# Altium footprint library 1.08-LED发光二极管.PcbLib: 72 footprints (part 2 of 5)
Each footprint in its own frame and in the unit in brackets; x right, y up, seen from the top. Pads: shape width x height; smd on the part's side, far side on the other; paste and mask are expansions set on the pad; w line width, h text height; cw(c..) or ccw(c..) is an arc to the next point about the centre after c.
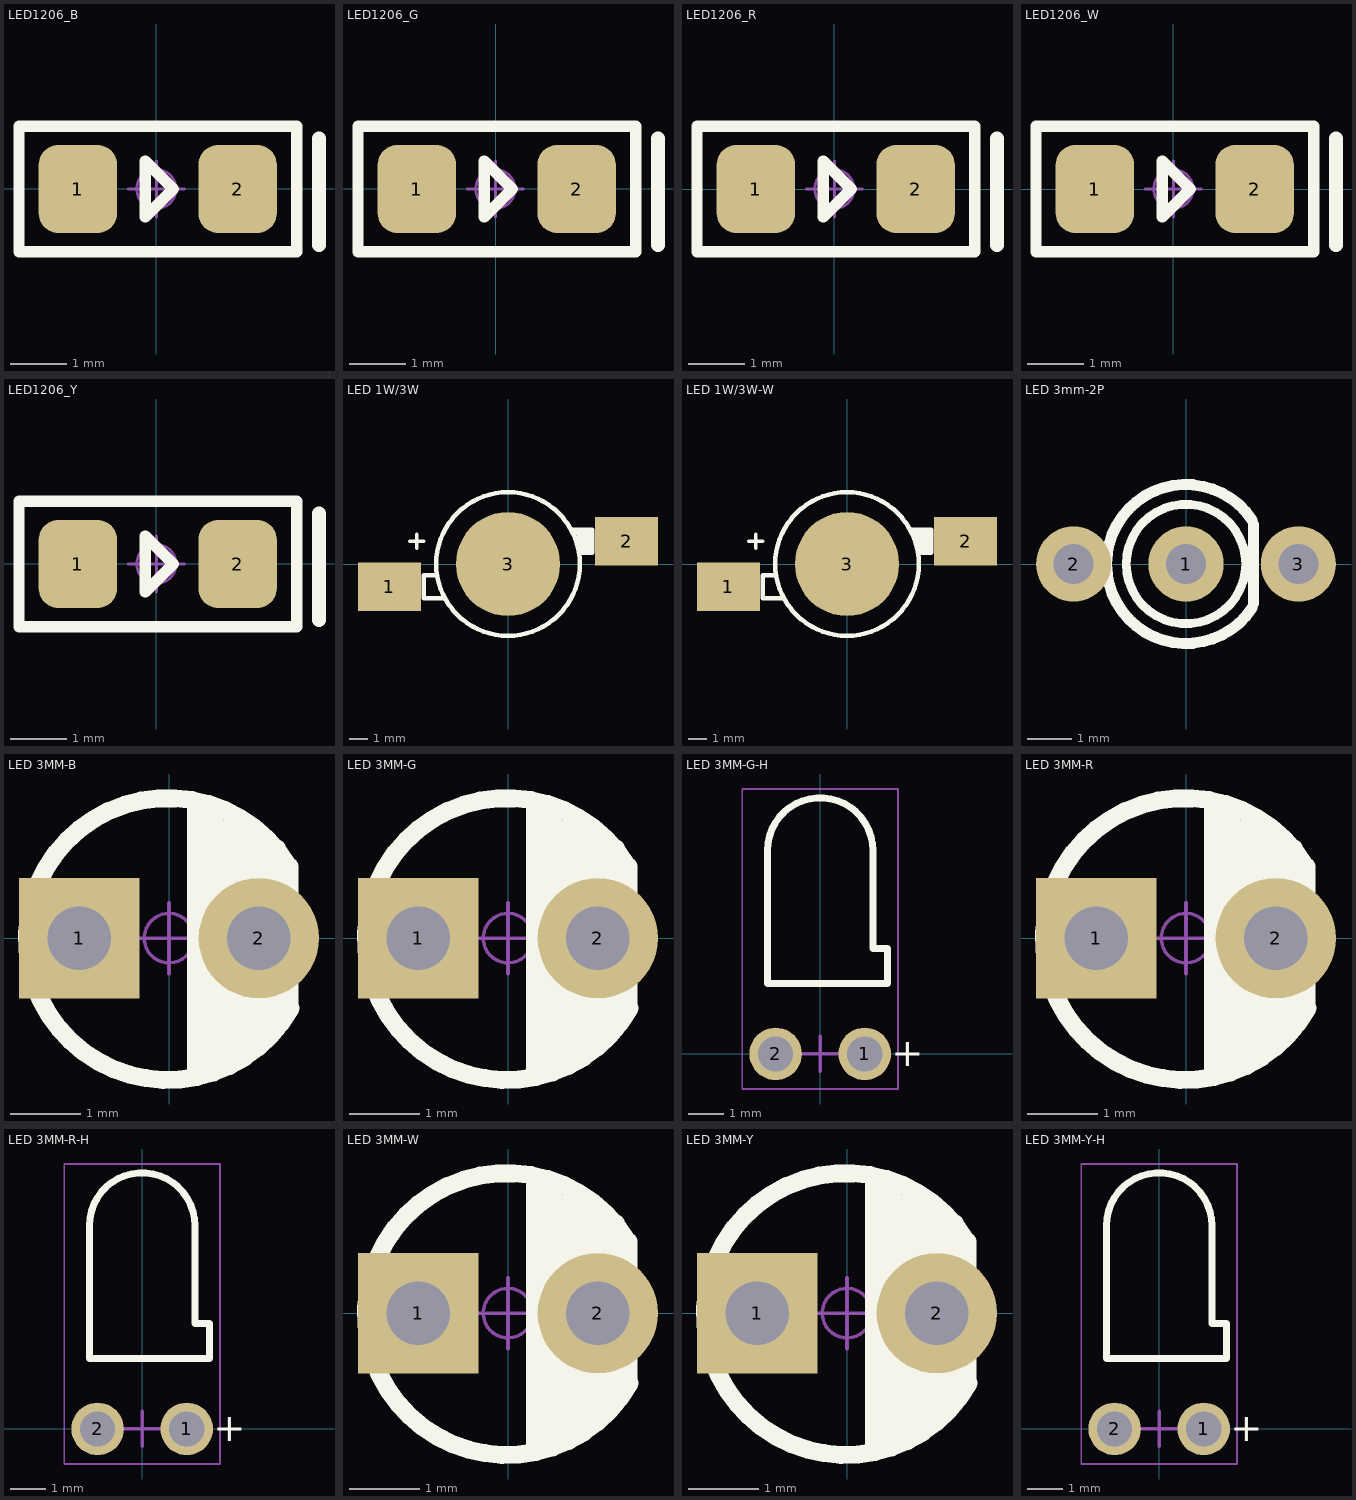
[diagram p1: the footprints below, top view; thin cyan lines are the x and y axes]

## LED1206_B [mil] "蓝色1206LED                             淘宝卖家ID:黄晶宝石"
pads (2):
  rrect50% 55x62 smd: 1(-55.12,0) 2(57.08,0)
Top Overlay:
  lines w8: -7.87,-19.68 -7.87,-19.68 ; -7.87,-19.68 11.81,0 -7.87,19.69 -7.87,-19.68 ; -96.46,-44 98.42,-44 98.42,44 -96.46,44 -96.46,-44
  lines w10: 114.17,-39.37 114.17,35.43
Mechanical 15:
  circle w1.97: c0,0 r13.78
  lines w1.97: -19.69,0 19.68,0 ; 0,-19.69 0,19.68
3D body: height 35.58, standoff -0.04, extent -63.02,-31.53 63.04,31.54
3D body: height 0, standoff 0, extent 0,0 0,0

## LED1206_G [mil] "绿色1206LED                             淘宝卖家ID:黄晶宝石"
pads (2):
  rrect50% 55x62 smd: 1(-55.28,0) 2(56.93,0)
Top Overlay:
  lines w8: -8.03,-19.68 -8.03,19.69 11.65,0 -8.03,-19.68 ; -8.03,-19.68 -8.03,-19.68 ; -96.62,-44 -96.62,44 98.27,44 98.27,-44 -96.62,-44
  lines w10: 114.02,-39.37 114.02,35.43
Mechanical 15:
  circle w1.97: c-0.16,0 r13.78
  lines w1.97: -19.84,0 19.52,0 ; -0.16,-19.69 -0.16,19.68
3D body: height 35.56, standoff -0.04, extent -63.19,-31.54 62.87,31.53
3D body: height 0, standoff 0, extent -0.16,0 -0.16,0

## LED1206_R [mil] "红色1206LED                            淘宝卖家ID:黄晶宝石"
pads (2):
  rrect50% 55x62 smd: 1(-55.12,0) 2(57.09,0)
Top Overlay:
  lines w8: -7.87,-19.68 -7.87,19.69 11.81,0 -7.87,-19.68 ; -7.87,-19.68 -7.87,-19.68 ; -96.46,-44 -96.46,44 98.43,44 98.43,-44 -96.46,-44
  lines w10: 114.18,-39.37 114.18,35.44
Mechanical 15:
  circle w1.97: c0,0 r13.78
  lines w1.97: -19.68,0 19.68,0 ; 0,-19.68 0,19.68
3D body: height 35.56, standoff -0.04, extent -63.03,-31.54 63.03,31.53
3D body: height 0, standoff 0, extent 0,0 0,0

## LED1206_W [mil] "白色1206LED                            淘宝卖家ID:黄晶宝石"
pads (2):
  rrect50% 55x62 smd: 1(-55.12,0) 2(57.09,0)
Top Overlay:
  lines w8: -7.87,-19.68 -7.87,-19.68 ; -7.87,-19.68 11.81,0 -7.87,19.69 -7.87,-19.68 ; -96.46,-44 98.43,-44 98.43,44 -96.46,44 -96.46,-44
  lines w10: 114.18,-39.37 114.18,35.44
Mechanical 15:
  circle w1.97: c0,0 r13.78
  lines w1.97: -19.68,0 19.68,0 ; 0,-19.68 0,19.68
3D body: height 0, standoff 0, extent 0,0 0,0
3D body: height 35.56, standoff -0.04, extent -63.03,-31.54 63.03,31.54

## LED1206_Y [mil] "黄色1206LED                            淘宝卖家ID:黄晶宝石"
pads (2):
  rrect50% 55x62 smd: 1(-55.12,-0.01) 2(57.08,-0.01)
Top Overlay:
  lines w8: -7.88,-19.69 -7.88,19.68 11.81,0 -7.88,-19.69 ; -7.88,-19.69 -7.88,-19.69 ; -96.46,-44.01 -96.46,43.99 98.42,43.99 98.42,-44.01 -96.46,-44.01
  lines w10: 114.17,-39.37 114.17,35.43
Mechanical 15:
  circle w1.97: c-0.01,-0.01 r13.78
  lines w1.97: -19.69,-0.01 19.68,-0.01 ; -0.01,-19.69 -0.01,19.68
3D body: height 35.56, standoff -0.04, extent -63.04,-31.54 63.02,31.53
3D body: height 0, standoff 0, extent 0,0 0,0

## LED 1W/3W [mm] "大功率LED"
pads (3):
  rect 3.5x2.7 smd: 1(-6.604,-1.27) 2(6.604,1.27)
  round 5.8 smd: 3(0,0)
Top Overlay:
  circle w0.254: c0,0 r4
  lines w0.203: -5.461,1.27 -4.699,1.27 ; -5.08,0.889 -5.08,1.651
  lines w0.254: -4.064,-0.635 -4.699,-0.635 -4.699,-1.905 -3.556,-1.905 ; 3.937,1.524 ccw(c3.556,1.524) 3.556,1.905 4.699,1.905 4.699,0.635 4.064,0.635 cw(c4.064,0.762) 3.937,0.762 3.937,1.905 ; 4.191,0.635 4.191,1.905 ; 4.445,0.635 4.445,1.905
Mechanical 15:
  circle w0.05: c0,0 r0.35
  lines w0.05: -0.5,0 0.5,0 ; 0,-0.5 0,0.5
3D body: height 3.65, standoff 0.05, extent -7.2,-4 7.2,4

## LED 1W/3W-W [mm] "白色，大功率LED"
pads (3):
  rect 3.5x2.7 smd: 1(-6.604,-1.27) 2(6.604,1.27)
  round 5.8 smd: 3(0,0)
Top Overlay:
  circle w0.254: c0,0 r4
  circle w0.254: c0,0 r2.65
  lines w0.203: -5.461,1.27 -4.699,1.27 ; -5.08,0.889 -5.08,1.651
  lines w0.254: -4.064,-0.635 -4.699,-0.635 -4.699,-1.905 -3.556,-1.905 ; 3.556,1.905 4.699,1.905 4.699,0.635 4.064,0.635 4.064,1.778 ccw(c3.937,1.778) 3.937,1.905 ; 3.683,1.905 cw(c3.683,1.778) 3.81,1.778 3.81,1.524 ; 3.81,1.905 cw(c3.81,1.778) 3.937,1.778 3.937,1.27 ; 4.191,0.635 4.191,1.905 ; 4.445,0.635 4.445,1.905
Mechanical 15:
  circle w0.05: c0,0 r0.35
  lines w0.05: -0.5,0 0.5,0 ; 0,-0.5 0,0.5
3D body: height 3.65, standoff 0.05, extent -7.2,-4 7.2,4

## LED 3mm-2P [mm] "3mm双色LED            联系卖家 免费查找封装"
height 5
pads (3):
  round 1.7 hole 0.9: 1(0,0) 2(-2.54,0) 3(2.54,0)
Top Overlay:
  circle w0.2: c0,0 r1.35
  lines w0.254: 1.494,-0.996 cw(c0,0) 1.494,0.996 ; 1.524,-0.889 1.524,0.889
3D body: height 3.82, standoff -3.15, extent -2.79,-0.743 2.79,0.743
3D body: height 6.9, standoff 1.4, extent -1.95,-1.95 1.696,1.95

## LED 3MM-B [mm] "蓝色3mm直插LED                       联系卖家 免费查找封装"
height 6.35
pads (2):
  rect 1.7x1.7 hole 0.9: 1(-1.27,0)
  round 1.7 hole 0.9: 2(1.27,0)
Top Overlay:
  lines w0.254: 0.381,-1.905 0.381,1.905 ; 0.635,-1.778 0.635,1.778 ; 1.016,-1.651 1.016,1.524 ; 1.524,1.27 1.524,-1.27 1.27,-1.524 1.27,1.397 1.143,1.524 1.016,1.524 ; 1.685,1.025 ccw(c-0.016,-0.012) 1.72,-0.987 ; 1.702,-0.965 1.702,1.016 ; 0.889,1.651 1.016,1.524 ; 0.889,1.651 0.889,-1.778 0.889,1.651
Mechanical 15:
  circle w0.05: c0,0 r0.35
  lines w0.05: -0.5,0 0.5,0 ; 0,-0.5 0,0.5
3D body: height 3, standoff -3.45, extent -1.623,-0.838 1.618,0.838
3D body: height 5.55, standoff 0.05, extent -1.95,-1.95 1.638,1.95

## LED 3MM-G [mm] "绿色3mm直插LED                       联系卖家 免费查找封装"
height 6.35
pads (2):
  rect 1.7x1.7 hole 0.9: 1(-1.27,0)
  round 1.7 hole 0.9: 2(1.27,0)
Top Overlay:
  lines w0.254: 0.381,-1.905 0.381,1.905 ; 0.635,-1.778 0.635,1.778 ; 1.016,-1.651 1.016,1.524 ; 1.524,1.27 1.524,-1.27 1.27,-1.524 1.27,1.397 1.143,1.524 1.016,1.524 ; 1.685,1.025 ccw(c-0.016,-0.012) 1.72,-0.987 ; 1.702,-0.965 1.702,1.016 ; 0.889,1.651 0.889,-1.778 0.889,1.651 ; 0.889,1.651 1.016,1.524
Mechanical 15:
  circle w0.05: c0,0 r0.35
  lines w0.05: -0.5,0 0.5,0 ; 0,-0.5 0,0.5
3D body: height 3.01, standoff -3.45, extent -1.623,-0.838 1.618,0.838
3D body: height 5.55, standoff 0.05, extent -1.95,-1.95 1.638,1.95

## LED 3MM-G-H [mm] "绿色3mm直插LED  卧式安装"
pads (2):
  round 1.5 hole 1: 1(1.27,0) 2(-1.27,0)
Top Overlay:
  lines w0.2: -1.5,2 -1.5,5.8 cw(c0,5.8) 1.5,5.8 1.5,3 1.925,3 1.925,2 -1.5,2
  text "+" at 2.95,-0.35 h0.8
Mechanical 13:
  lines w0.1: -1.5,2 -1.5,5.8 cw(c0,5.8) 1.5,5.8 1.5,3 1.925,3 1.925,2 -1.5,2
Mechanical 15:
  lines w0.05: -2.22,-1 2.22,-1 2.22,7.55 -2.22,7.55 -2.22,-1
  lines w0.1: -0.5,0 0.5,0 ; 0,-0.5 0,0.5
3D body: height 3.92, standoff -3.2, extent -1.645,-0.25 1.92,7.3

## LED 3MM-R [mm] "红色3mm直插LED                        联系卖家 免费查找封装"
height 6.35
pads (2):
  rect 1.7x1.7 hole 0.9: 1(-1.27,0)
  round 1.7 hole 0.9: 2(1.27,0)
Top Overlay:
  lines w0.254: 0.381,-1.905 0.381,1.905 ; 0.635,-1.778 0.635,1.778 ; 1.016,-1.651 1.016,1.524 ; 1.524,1.27 1.524,-1.27 1.27,-1.524 1.27,1.397 1.143,1.524 1.016,1.524 ; 1.685,1.025 ccw(c-0.016,-0.012) 1.72,-0.987 ; 1.702,-0.965 1.702,1.016 ; 0.889,1.651 0.889,-1.778 0.889,1.651 ; 0.889,1.651 1.016,1.524
Mechanical 15:
  circle w0.05: c0,0 r0.35
  lines w0.05: -0.5,0 0.5,0 ; 0,-0.5 0,0.5
3D body: height 5.55, standoff 0.05, extent -1.95,-1.95 1.638,1.95
3D body: height 3.01, standoff -3.45, extent -1.639,-0.85 1.603,0.827

## LED 3MM-R-H [mm] "红色3mm直插LED  卧式安装"
pads (2):
  round 1.5 hole 1: 1(1.27,0) 2(-1.27,0)
Top Overlay:
  lines w0.2: -1.5,2 -1.5,5.8 cw(c0,5.8) 1.5,5.8 1.5,3 1.925,3 1.925,2 -1.5,2
  text "+" at 2.95,-0.35 h0.8
Mechanical 13:
  lines w0.1: -1.5,2 -1.5,5.8 cw(c0,5.8) 1.5,5.8 1.5,3 1.925,3 1.925,2 -1.5,2
Mechanical 15:
  lines w0.05: -2.22,-1 2.22,-1 2.22,7.55 -2.22,7.55 -2.22,-1
  lines w0.1: -0.5,0 0.5,0 ; 0,-0.5 0,0.5
3D body: height 3.92, standoff -3.2, extent -1.645,-0.25 1.925,7.3

## LED 3MM-W [mm] "白色3mm直插LED                        联系卖家 免费查找封装"
height 6.35
pads (2):
  rect 1.7x1.7 hole 0.9: 1(-1.27,0)
  round 1.7 hole 0.9: 2(1.27,0)
Top Overlay:
  lines w0.254: 0.381,-1.905 0.381,1.905 ; 0.635,-1.778 0.635,1.778 ; 1.016,-1.651 1.016,1.524 ; 1.524,1.27 1.524,-1.27 1.27,-1.524 1.27,1.397 1.143,1.524 1.016,1.524 ; 1.685,1.025 ccw(c-0.016,-0.012) 1.72,-0.987 ; 1.702,-0.965 1.702,1.016 ; 0.889,1.651 0.889,-1.778 0.889,1.651 ; 0.889,1.651 1.016,1.524
Mechanical 15:
  circle w0.05: c0,0 r0.35
  lines w0.05: -0.5,0 0.5,0 ; 0,-0.5 0,0.5
3D body: height 5.55, standoff 0.05, extent -1.95,-1.95 1.638,1.95
3D body: height 2.56, standoff -3.45, extent -1.623,-0.838 1.618,0.838

## LED 3MM-Y [mm] "黄色3mm直插LED"
height 6.35
pads (2):
  rect 1.7x1.7 hole 0.9: 1(-1.27,0)
  round 1.7 hole 0.9: 2(1.27,0)
Top Overlay:
  lines w0.254: 0.381,-1.905 0.381,1.905 ; 0.635,-1.778 0.635,1.778 ; 0.889,-1.778 0.889,1.651 1.016,1.524 ; 1.016,-1.651 1.016,1.524 ; 1.524,1.27 1.524,-1.27 1.27,-1.524 1.27,1.397 1.143,1.524 1.016,1.524 ; 1.685,1.025 ccw(c-0.016,-0.012) 1.72,-0.987 ; 1.702,-0.965 1.702,1.016
Mechanical 15:
  circle w0.05: c0,0 r0.35
  lines w0.05: -0.5,0 0.5,0 ; 0,-0.5 0,0.5
3D body: height 2.56, standoff -3.45, extent -1.639,-0.85 1.603,0.827
3D body: height 5.55, standoff 0.05, extent -1.95,-1.95 1.638,1.95

## LED 3MM-Y-H [mm] "黄色3mm直插LED  卧式安装          淘宝卖家ID:黄晶宝石"
pads (2):
  round 1.5 hole 1: 1(1.27,0) 2(-1.27,0)
Top Overlay:
  lines w0.2: -1.5,2 -1.5,5.8 cw(c0,5.8) 1.5,5.8 1.5,3 1.925,3 1.925,2 -1.5,2
  text "+" at 2.95,-0.35 h0.8
Mechanical 13:
  lines w0.1: -1.5,2 -1.5,5.8 cw(c0,5.8) 1.5,5.8 1.5,3 1.925,3 1.925,2 -1.5,2
Mechanical 15:
  lines w0.05: -2.22,-1 2.22,-1 2.22,7.55 -2.22,7.55 -2.22,-1
  lines w0.1: -0.5,0 0.5,0 ; 0,-0.5 0,0.5
3D body: height 3.92, standoff -3.2, extent -1.645,-0.25 1.925,7.3